# Altium footprint library My Library.PcbLib: 872 footprints (part 30 of 55)
Each footprint in its own frame and in the unit in brackets; x right, y up, seen from the top. Pads: shape width x height; smd on the part's side, far side on the other; paste and mask are expansions set on the pad; w line width, h text height; cw(c..) or ccw(c..) is an arc to the next point about the centre after c.
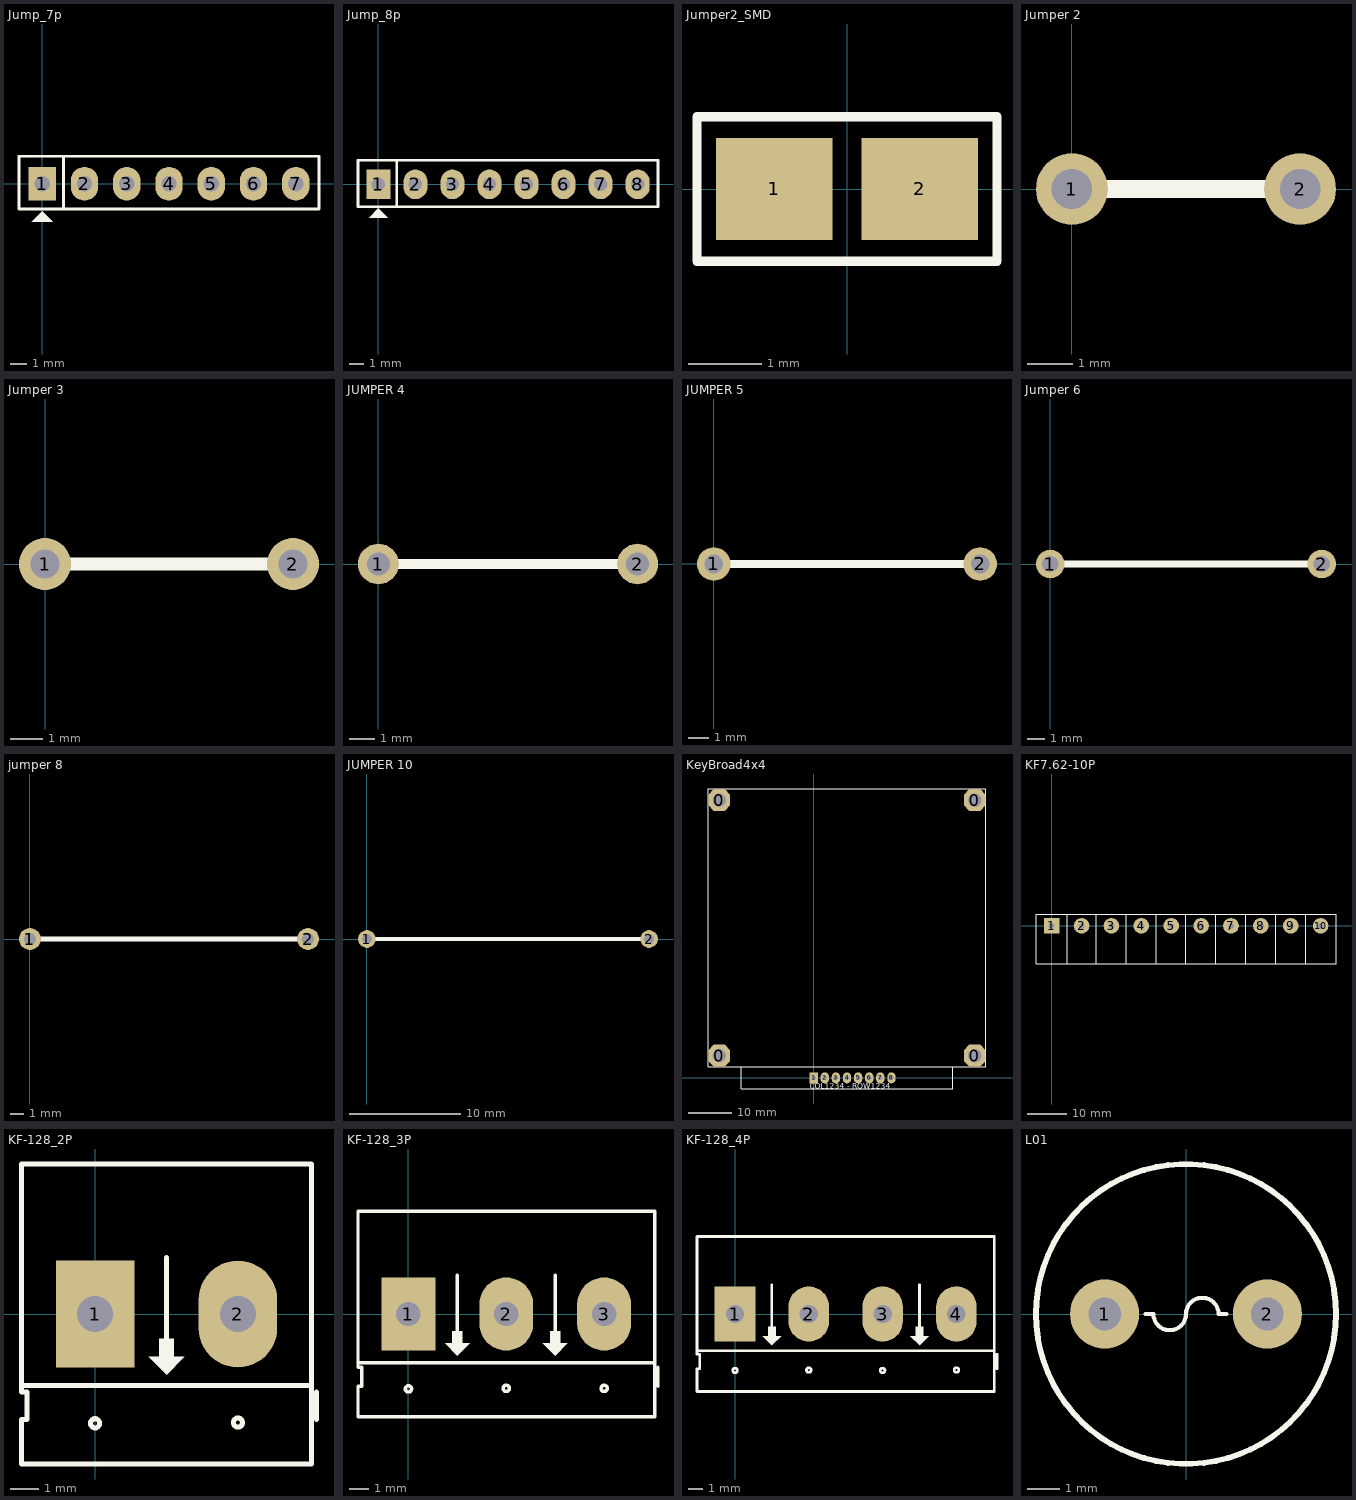
[diagram p29: the footprints below, top view; thin cyan lines are the x and y axes]

## Jump_7p [mil]
pads (7):
  rect 65x80 hole 36: 1(0,0)
  oval 65x80 hole 36: 2(100,0) 3(200,0) 4(300,0) 5(400,0) 6(500,0) 7(600,0)
Top Overlay:
  region: 0,-65 -25,-90 25,-90
  lines w7: 50,-60 50,65 ; -55,-60 655,-60 655,65 -55,65 -55,-60
3D body "JP1-7.stp": height 323.44, standoff -117.51, extent -49.99,-49.2 646.07,49.22

## Jump_8p [mil]
pads (8):
  rect 65x80 hole 36: 1(0,0)
  oval 65x80 hole 36: 2(100,0) 3(200,0) 4(300,0) 5(400,0) 6(500,0) 7(600,0) 8(700,0)
Top Overlay:
  region: 0,-65 -25,-90 25,-90
  lines w7: 50,-60 50,65 ; -55,-60 -55,65 755,65 755,-60 -55,-60
3D body "JP1-8.stp": height 323.43, standoff -117.51, extent -49.99,-49.21 746.07,49.22

## Jumper2_SMD [mm] "Compoment SMD 80x50mil"
height 1.27
pads (2):
  rect 1.6x1.397 smd: 1(-1,0) 2(1,0)
Top Overlay:
  lines w0.127: -2.057,-0.991 2.057,-0.991 2.057,0.991 -2.057,0.991 -2.057,-0.991
3D body "SW3dPS-0805 SMD Resistor.STEP": height 0.78, standoff 0, extent -1,-0.625 1,0.625

## Jumper 2 [mm]
pads (2):
  round 1.6 hole 0.9: 1(0,0) 2(5.08,0)
Top Overlay:
  lines w0.4: 0,0 5.08,0

## Jumper 3 [mm]
pads (2):
  round 1.6 hole 0.9: 1(0,0) 2(7.62,0)
Top Overlay:
  lines w0.4: 0,0 7.62,0

## JUMPER 4 [mm]
pads (2):
  round 1.6 hole 0.9: 1(0,0) 2(10.16,0)
Top Overlay:
  lines w0.4: 0,0 10.16,0

## JUMPER 5 [mm]
pads (2):
  round 1.6 hole 0.9: 1(0,0) 2(12.7,0)
Top Overlay:
  lines w0.4: 0,0 12.7,0

## Jumper 6 [mm]
pads (2):
  round 1.6 hole 0.9: 1(0,0) 2(15.24,0)
Top Overlay:
  lines w0.4: 0,0 15.24,0

## jumper 8 [mm]
pads (2):
  round 1.6 hole 0.9: 1(0,0) 2(20.32,0)
Top Overlay:
  lines w0.4: 0,0 20.32,0

## JUMPER 10 [mm]
pads (2):
  round 1.6 hole 0.9: 1(0,0) 2(25.4,0)
Top Overlay:
  lines w0.4: 0,0 25.4,0

## KeyBroad4x4 [mm] "KeyBroad 4x4"
height 5.08
pads (12):
  oct 5x5 hole 3.048: 0(-21.59,5.08) 0(-21.59,63.5) 0(36.83,5.08) 0(36.83,63.5)
  rect 1.905x2.5 hole 1: 1(0,0)
  oval 1.905x2.5 hole 1: 2(2.54,0) 3(5.08,0) 4(7.62,0) 5(10.16,0) 6(12.7,0) 7(15.24,0) 8(17.78,0)
Top Overlay:
  lines w0.203: -16.51,2.54 -16.51,-2.515 -16.535,-2.54 31.75,-2.54 31.75,2.489 ; -24.13,2.54 -24.13,66.04 39.37,66.04 39.37,2.54 -24.13,2.54
  text "COL1234 - ROW1234" at -0.889,-2.464 h1.27

## KF7.62-10P [mm]
pads (10):
  rect 4x4 hole 1.5: 1(0,0)
  round 4 hole 1.5: 2(7.62,0) 3(15.24,0) 4(22.86,0) 5(30.48,0) 6(38.1,0) 7(45.72,0) 8(53.34,0) 9(60.96,0) 10(68.58,0)
Top Overlay:
  lines w0.254: 4,-9.7 4,3 ; 11.4,-9.7 11.4,3 ; 19,-9.6 19,3 ; 26.6,-9.7 26.6,3 ; 34.2,-9.65 34.2,3 ; 41.8,-9.6 41.8,3 ; 49.5,-9.7 49.5,3 ; 57.1,-9.7 57.1,3 ; 64.8,-9.6 64.8,3 ; -4,-9.7 -4,3 72.5,3 72.5,-9.7 -4,-9.7
3D body "User Library-7_62-2P.STEP": height 12.51, standoff -6.24, extent 57.099,-9.577 72.339,2.923
3D body "User Library-7_62-2P.STEP": height 12.51, standoff -6.24, extent 41.859,-9.577 57.099,2.923
3D body "User Library-7_62-2P.STEP": height 12.51, standoff -6.24, extent 26.619,-9.577 41.859,2.923
3D body "User Library-7_62-2P.STEP": height 12.51, standoff -6.24, extent 11.379,-9.577 26.619,2.923
3D body "User Library-7_62-2P.STEP": height 12.51, standoff -6.24, extent -3.861,-9.577 11.379,2.923

## KF-128_2P [mm]
height 7.62
pads (2):
  rect 2.794x3.8 hole 1.27: 1(0,0)
  oval 2.794x3.8 hole 1.27: 2(5.08,0)
Top Overlay:
  circle w0.178: c0,-3.886 r0.163
  circle w0.178: c5.08,-3.861 r0.163
  region: 2.54,-2.159 3.175,-1.524 2.794,-1.524 2.794,-0.889 2.286,-0.889 2.286,-1.524 1.905,-1.524
  lines w0.178: -2.515,-2.54 7.569,-2.54 ; 2.54,-1.829 2.54,2.007 ; 7.874,-3.759 7.874,-2.769 ; -2.616,-5.334 -2.616,-3.759 -2.413,-3.759 -2.413,-2.769 -2.616,-2.769 -2.616,5.334 7.696,5.334 7.696,-5.334 -2.616,-5.334
3D body "User Library-KF128.STEP": height 14.3, standoff -5, extent 2.524,-5.225 8.204,5.275
3D body "User Library-KF128.STEP": height 14.3, standoff -5, extent -2.556,-5.25 3.124,5.25

## KF-128_3P [mm]
height 7.62
pads (3):
  rect 2.794x3.8 hole 1.27: 1(0,0)
  oval 2.794x3.8 hole 1.27: 2(5.08,0) 3(10.16,0)
Top Overlay:
  circle w0.178: c5.08,-3.861 r0.163
  circle w0.178: c10.16,-3.861 r0.163
  circle w0.178: c0,-3.886 r0.163
  region: 2.54,-2.159 3.175,-1.524 2.794,-1.524 2.794,-0.889 2.286,-0.889 2.286,-1.524 1.905,-1.524
  region: 7.62,-2.159 8.255,-1.524 7.874,-1.524 7.874,-0.889 7.366,-0.889 7.366,-1.524 6.985,-1.524
  lines w0.178: -2.515,-2.54 12.776,-2.54 ; 2.54,-1.829 2.54,2.007 ; 7.62,-1.829 7.62,2.007 ; 12.954,-3.759 12.954,-2.769 ; -2.616,-5.334 12.776,-5.334 12.776,5.334 -2.616,5.334 -2.616,-2.769 -2.413,-2.769 -2.413,-3.759 -2.616,-3.759 -2.616,-5.334
3D body "User Library-KF128.STEP": height 14.3, standoff -5, extent 2.524,-5.225 8.204,5.275
3D body "User Library-KF128.STEP": height 14.3, standoff -5, extent 7.604,-5.225 13.284,5.275
3D body "User Library-KF128.STEP": height 14.3, standoff -5, extent -2.556,-5.25 3.124,5.25

## KF-128_4P [mm]
height 7.62
pads (4):
  rect 2.794x3.8 hole 1.27: 1(0,0)
  oval 2.794x3.8 hole 1.27: 2(5.08,0) 3(10.16,0) 4(15.24,0)
Top Overlay:
  circle w0.178: c10.16,-3.886 r0.163
  circle w0.178: c15.24,-3.861 r0.163
  circle w0.178: c5.08,-3.861 r0.163
  circle w0.178: c0,-3.886 r0.163
  region: 12.7,-2.159 13.335,-1.524 12.954,-1.524 12.954,-0.889 12.446,-0.889 12.446,-1.524 12.065,-1.524
  region: 2.54,-2.159 3.175,-1.524 2.794,-1.524 2.794,-0.889 2.286,-0.889 2.286,-1.524 1.905,-1.524
  lines w0.178: -2.515,-2.54 7.569,-2.54 ; 2.54,-1.829 2.54,2.007 ; 7.544,-5.334 17.856,-5.334 17.856,5.334 7.544,5.334 ; 7.645,-2.54 17.729,-2.54 ; 7.696,-5.334 -2.616,-5.334 -2.616,-3.759 -2.413,-3.759 -2.413,-2.769 -2.616,-2.769 -2.616,5.334 7.696,5.334 ; 12.7,-1.829 12.7,2.007 ; 18.034,-3.759 18.034,-2.769
3D body "User Library-KF128.STEP": height 14.3, standoff -5, extent 12.684,-5.225 18.364,5.275
3D body "User Library-KF128.STEP": height 14.3, standoff -5, extent 7.604,-5.25 13.284,5.25
3D body "User Library-KF128.STEP": height 14.3, standoff -5, extent -2.556,-5.25 3.124,5.25
3D body "User Library-KF128.STEP": height 14.3, standoff -5, extent 2.524,-5.225 8.204,5.275

## L01 [mil] "Inductor"
pads (2):
  round 85 hole 40: 1(-100,0) 2(100,0)
Top Overlay:
  circle w7: c0,0 r184.39
  lines w5: -50,0 -40,0 ccw(c-20,0) 0,0 cw(c20,0) 40,0 50,0